# Altium footprint library PCB贴片元件封装库.pcblib: 366 footprints (part 6 of 23)
Each footprint in its own frame and in the unit in brackets; x right, y up, seen from the top. Pads: shape width x height; smd on the part's side, far side on the other; paste and mask are expansions set on the pad; w line width, h text height; cw(c..) or ccw(c..) is an arc to the next point about the centre after c.
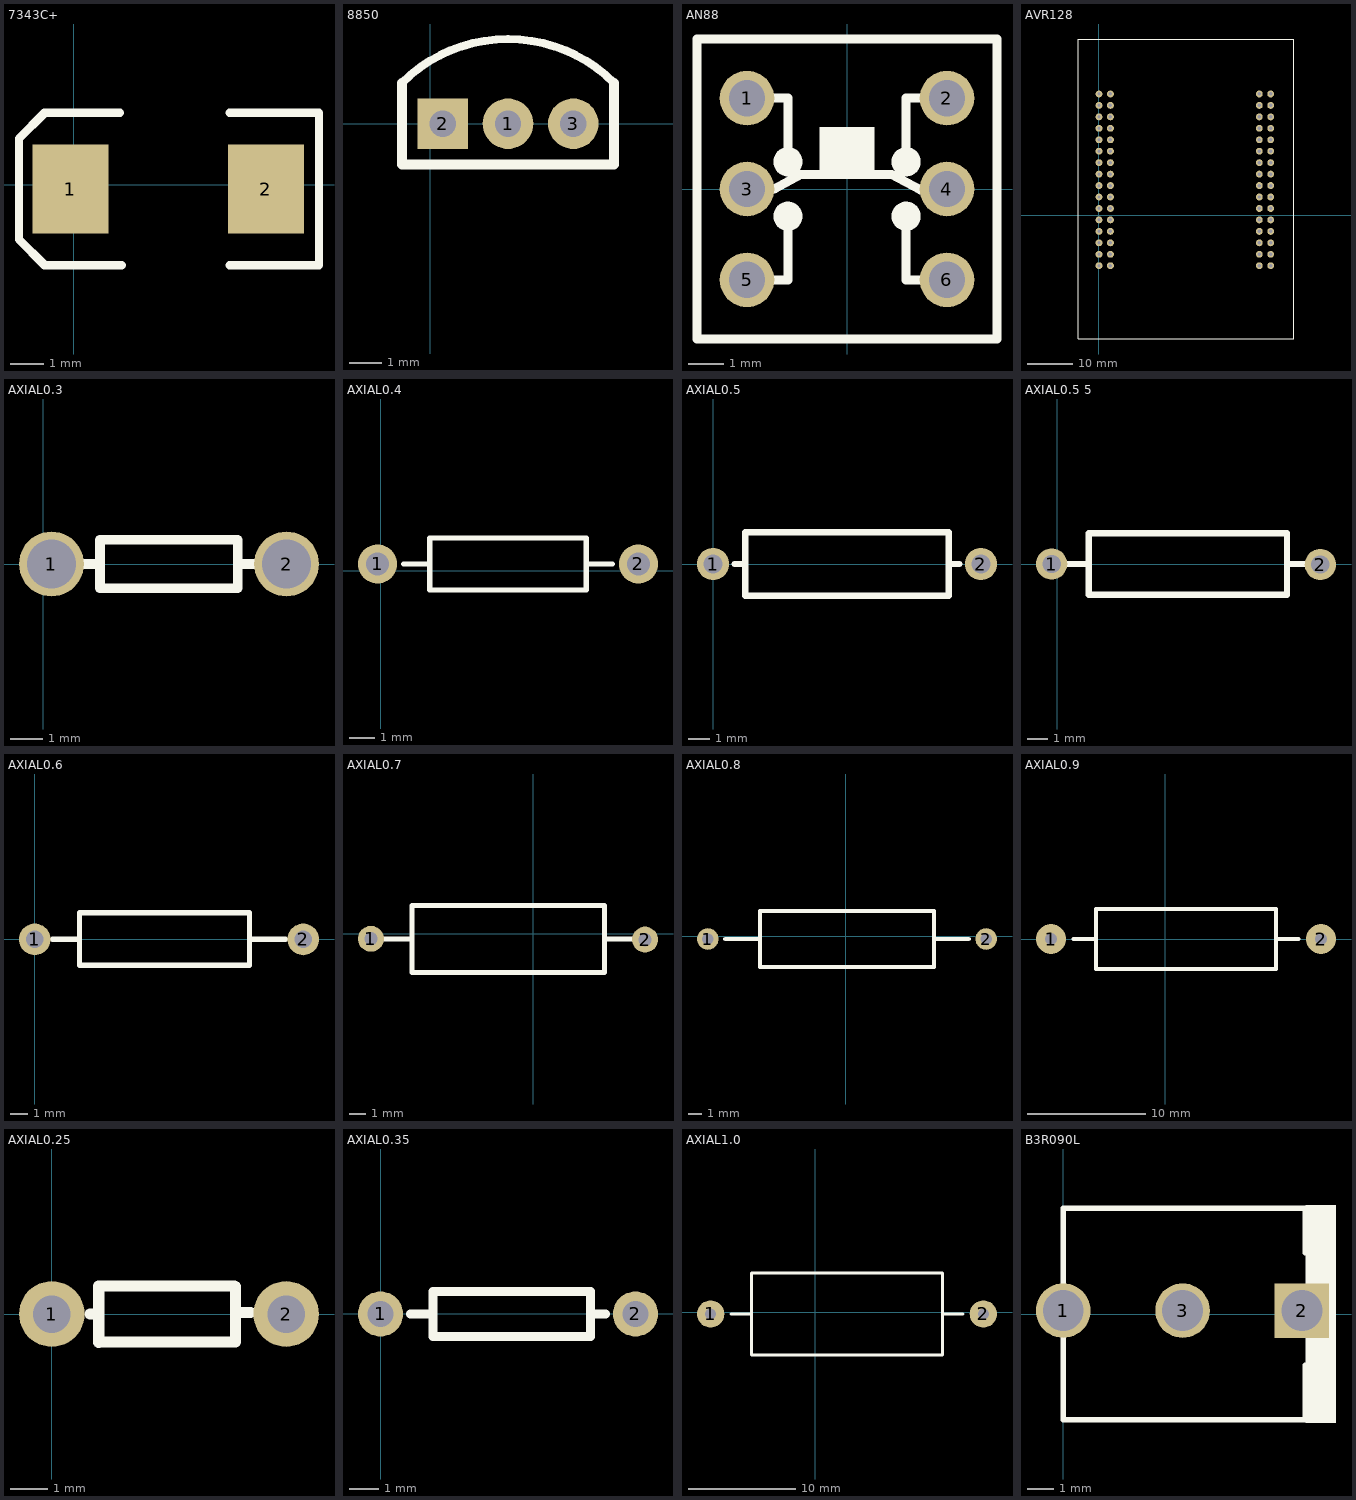
[diagram p5: the footprints below, top view; thin cyan lines are the x and y axes]

## 7343C+ [mil]
pads (2):
  rect 90x106.3 smd: 1(-3.94,-5) 2(228.35,-5)
TopOverlay:
  lines w10: 55,85.55 -35,85.55 -35,85 -65,55 -65,-65 -35,-95 -35,-95.55 57,-95.55 ; 185,-95.55 290,-95.55 ; 185,85.55 290,85.55 ; 291.34,-95.55 291.34,85.55

## 8850 [mil]
pads (3):
  round 62 hole 32: 1(95,0) 3(175,0)
  rect 62x62 hole 32: 2(15,0)
TopOverlay:
  lines w10: -35,50 cw(c95,-80) 225,50
  lines w12: -35,50 -35,-50 225,-50 225,50

## AN88 [mil]
pads (6):
  round 60 hole 40: 1(-110,100) 2(110,100) 3(-110,0) 4(110,0) 5(-110,-100) 6(110,-100)
TopOverlay:
  circle w18: c-65,30 r7.07
  circle w18: c65,30 r7.07
  circle w18: c65,-30 r7.07
  circle w18: c-65,-30 r7.07
  rectangle: -30,16 30,68
  lines w10: -110,-100 -65,-100 -65,-40 ; -110,0 -80,0 -51,16 49,16 81,-1 109,-1 110,0 ; -110,100 -65,100 -65,30 ; 65,-40 65,-100 110,-100 ; 65,40 65,100 110,100 ; -165,-165 -165,165 165,165 165,-165 -165,-165

## AVR128 [mil]
pads (64):
  round 60 hole 30: 1(0,1060) 2(0,960) 3(0,860) 4(0,760) 5(0,660) 6(0,560) 7(0,460) 8(0,360) 9(0,260) 10(0,160) 11(0,60) 12(0,-40) 13(0,-140) 14(0,-240) 15(0,-340) 16(0,-440) 17(100,1060) 18(100,960) 19(100,860) 20(100,760) 21(100,660) 22(100,560) 23(100,460) 24(100,360) 25(100,260) 26(100,160) 27(100,60) 28(100,-40) 29(100,-140) 30(100,-240) 31(100,-340) 32(100,-440) 33(1400,1060) 34(1400,960) 35(1400,860) 36(1400,760) 37(1400,660) 38(1400,560) 39(1400,460) 40(1400,360) 41(1400,260) 42(1400,160) 43(1400,60) 44(1400,-40) 45(1400,-140) 46(1400,-240) 47(1400,-340) 48(1400,-440) 49(1500,1060) 50(1500,960) 51(1500,860) 52(1500,760) 53(1500,660) 54(1500,560) 55(1500,460) 56(1500,360) 57(1500,260) 58(1500,160) 59(1500,60) 60(1500,-40) 61(1500,-140) 62(1500,-240) 63(1500,-340) 64(1500,-440)
TopOverlay:
  lines w10: -180,-1080 -180,-880 -180,1540 1680,1540 1700,1540 1700,-880 1700,-1080 1660,-1080 -180,-1080

## AXIAL0.3 [mil]
pads (2):
  round 80 hole 60: 1(10,0) 2(300,0)
TopOverlay:
  lines w11.81: 70,-30 240,-30 240,0 240,30 70,30 70,-30
  lines w12: 50,0 70,0 ; 70,-30 70,30 ; 240,0 260,0

## AXIAL0.4 [mil]
pads (2):
  round 60 hole 35: 1(-5,10) 2(395,10)
TopOverlay:
  lines w7.87: 35,10 75,10 ; 315,10 355,10 ; 75,-30 75,50 315,50 315,-30 75,-30

## AXIAL0.5 [mil]
pads (2):
  round 60 hole 35: 1(0,0) 2(500,0)
TopOverlay:
  lines w11.81: 440,-59.05 440,59.05
  lines w12: 40,0 60,0 ; 440,-59.05 60,-59.05 60,59.05 440,59.05 ; 440,0 460,0

## AXIAL0.5 5 [mil]
pads (2):
  round 60 hole 35: 1(-11,0) 2(504,-1)
TopOverlay:
  lines w11.81: 440,-59.05 440,59.05
  lines w12: 17,0 60,0 ; 440,-59.05 60,-59.05 60,59.05 440,59.05 ; 440,0 485,0

## AXIAL0.6 [mm]
pads (2):
  round 1.8 hole 1: 1(0,0) 2(15.24,0)
TopOverlay:
  lines w0.3: 12.192,-1.476 12.192,1.524
  lines w0.305: 1.016,0 2.54,0 ; 12.192,-1.476 2.54,-1.476 2.54,1.524 12.192,1.524 ; 12.192,0 14.224,0

## AXIAL0.7 [mil]
pads (2):
  round 62 hole 32: 1(-388,-12) 2(267,-14)
TopOverlay:
  lines w12: -359.92,-12.56 -289.92,-12.56 ; 170.08,-12.56 240.08,-12.56 ; -289.92,-92.56 -289.92,67.44 170.08,67.44 170.08,-92.56 -289.92,-92.56

## AXIAL0.8 [mil]
pads (2):
  round 62 hole 32: 1(-395.83,-8.03) 2(404.17,-8.03)
TopOverlay:
  lines w12: -345.83,-8.03 -245.83,-8.03 ; 254.17,-8.03 354.17,-8.03 ; -245.83,-88.03 254.17,-88.03 254.17,71.97 -245.83,71.97 -245.83,-88.03

## AXIAL0.9 [mil]
pads (2):
  round 100 hole 40: 1(-380.79,0.91) 2(519.21,0.91)
TopOverlay:
  lines w12: -305.79,0.91 -230.79,0.91 ; 369.21,0.91 444.21,0.91 ; -230.79,-99.09 -230.79,100.91 369.21,100.91 369.21,-99.09 -230.79,-99.09

## AXIAL0.25 [mil]
pads (2):
  round 70 hole 40: 1(0,0) 2(250,0)
TopOverlay:
  lines w11.81: 50,-30 195.81,-30 195.81,29.06 194.87,30 50,30
  lines w12: 41,0 50,0 ; 50,-30 50,30 ; 202.7,1.63 211.7,1.63

## AXIAL0.35 [mil]
pads (2):
  round 60 hole 35: 1(0,0) 2(340,0)
TopOverlay:
  lines w11.81: 70,-30 70,30 280,30 280,0 280,-30 70,-30
  lines w12: 40,0 70,0 ; 70,-30 70,30 ; 280,0 300,0

## AXIAL1.0 [mil]
pads (2):
  round 100 hole 40: 1(-383.31,-7.01) 2(616.69,-7.01)
TopOverlay:
  lines w12: -308.31,-7.01 -233.31,-7.01 ; 466.69,-7.01 541.69,-7.01 ; -233.31,-157.01 -233.31,142.99 466.69,142.99 466.69,-157.01 -233.31,-157.01

## B3R090L [mil]
pads (3):
  round 80 hole 60: 1(0,5) 3(175,5)
  rect 80x80 hole 60: 2(350,5)
TopOverlay:
  rectangle: 355,-65 400,160
  rectangle: 355,-160 400,-55
  lines w7.87: 355,-75 355,-155 0,-155 0,155 355,155 355,90